# Altium footprint library ICs And Semiconductors SMD.PcbLib: 602 footprints (part 21 of 38)
Each footprint in its own frame and in the unit in brackets; x right, y up, seen from the top. Pads: shape width x height; smd on the part's side, far side on the other; paste and mask are expansions set on the pad; w line width, h text height; cw(c..) or ccw(c..) is an arc to the next point about the centre after c.
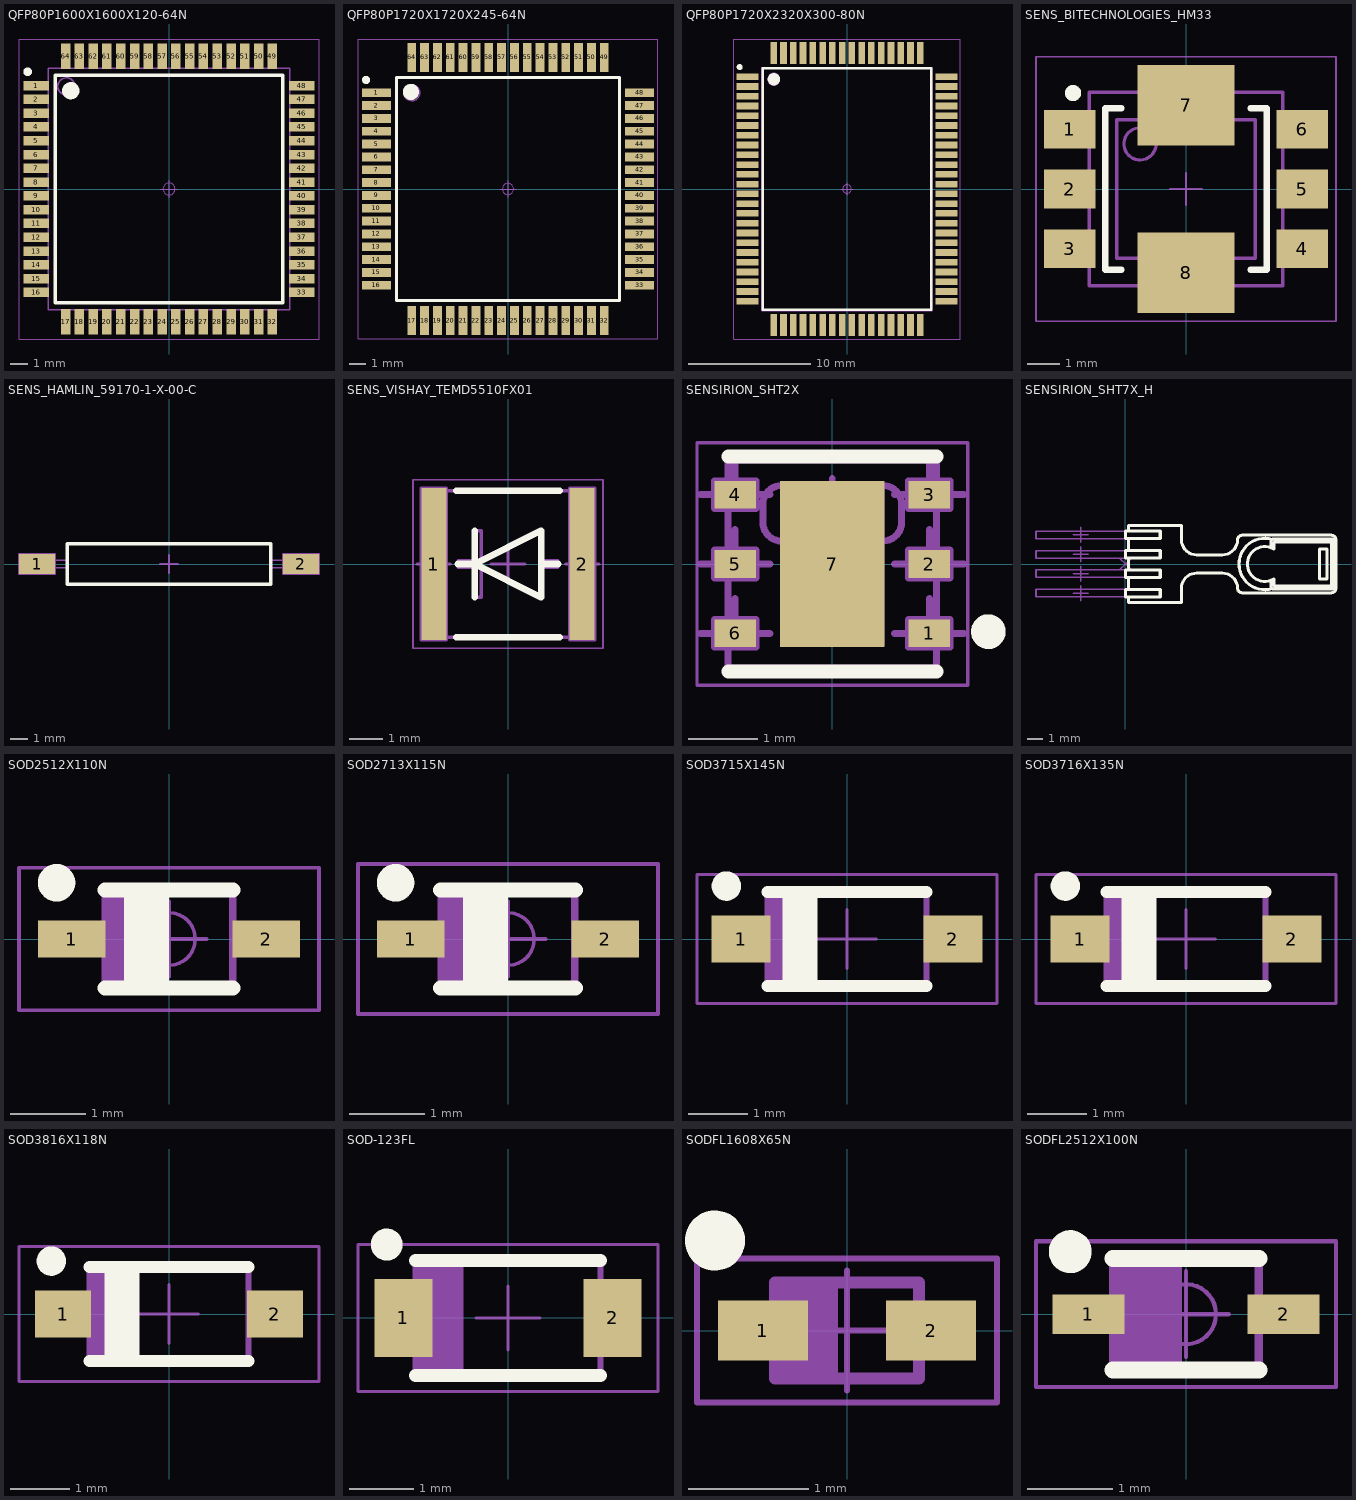
[diagram p20: the footprints below, top view; thin cyan lines are the x and y axes]

## QFP80P1600X1600X120-64N [mm] "QFP, 0.80mm Pitch, Square; 64 Pin, 14.00mm L X 14.00mm W X 1.20mm H Body, IPC Medium Density"
height 1.2
pads (64):
  rect 1.5x0.55 smd: 1(-7.7,6) 2(-7.7,5.2) 3(-7.7,4.4) 4(-7.7,3.6) 5(-7.7,2.8) 6(-7.7,2) 7(-7.7,1.2) 8(-7.7,0.4) 9(-7.7,-0.4) 10(-7.7,-1.2) 11(-7.7,-2) 12(-7.7,-2.8) 13(-7.7,-3.6) 14(-7.7,-4.4) 15(-7.7,-5.2) 16(-7.7,-6) 33(7.7,-6) 34(7.7,-5.2) 35(7.7,-4.4) 36(7.7,-3.6) 37(7.7,-2.8) 38(7.7,-2) 39(7.7,-1.2) 40(7.7,-0.4) 41(7.7,0.4) 42(7.7,1.2) 43(7.7,2) 44(7.7,2.8) 45(7.7,3.6) 46(7.7,4.4) 47(7.7,5.2) 48(7.7,6)
  rect 0.55x1.5 smd: 17(-6,-7.7) 18(-5.2,-7.7) 19(-4.4,-7.7) 20(-3.6,-7.7) 21(-2.8,-7.7) 22(-2,-7.7) 23(-1.2,-7.7) 24(-0.4,-7.7) 25(0.4,-7.7) 26(1.2,-7.7) 27(2,-7.7) 28(2.8,-7.7) 29(3.6,-7.7) 30(4.4,-7.7) 31(5.2,-7.7) 32(6,-7.7) 49(6,7.7) 50(5.2,7.7) 51(4.4,7.7) 52(3.6,7.7) 53(2.8,7.7) 54(2,7.7) 55(1.2,7.7) 56(0.4,7.7) 57(-0.4,7.7) 58(-1.2,7.7) 59(-2,7.7) 60(-2.8,7.7) 61(-3.6,7.7) 62(-4.4,7.7) 63(-5.2,7.7) 64(-6,7.7)
Top Overlay:
  circle w0.25: c-8.2,6.8 r0.125
  circle w0.5: c-5.7,5.7 r0.25
  lines w0.2: -6.6,-6.6 6.6,-6.6 6.6,6.6 -6.6,6.6 -6.6,-6.6
Mechanical 14:
  circle w0.1: c-5.95,5.95 r0.5
  lines w0.1: -7,-7 7,-7 7,7 -7,7 -7,-7
Mechanical 15:
  circle w0.05: c0,0 r0.35
  lines w0.05: -0.5,0 0.5,0 ; 0,-0.5 0,0.5 ; -8.7,-8.7 8.7,-8.7 8.7,8.7 -8.7,8.7 -8.7,-8.7
3D body "QFP80P1600X1600X120-64N.stp": height 1.2, standoff 0, extent -8.016,-8.016 8.016,8.016

## QFP80P1720X1720X245-64N [mm] "QFP, 0.80mm Pitch, Square; 64 pin, 14.00mm L X 14.00mm W X 2.45mm H body, IPC Medium Density"
height 2.45
pads (64):
  rect 1.8x0.55 smd: 1(-8.2,6) 2(-8.2,5.2) 3(-8.2,4.4) 4(-8.2,3.6) 5(-8.2,2.8) 6(-8.2,2) 7(-8.2,1.2) 8(-8.2,0.4) 9(-8.2,-0.4) 10(-8.2,-1.2) 11(-8.2,-2) 12(-8.2,-2.8) 13(-8.2,-3.6) 14(-8.2,-4.4) 15(-8.2,-5.2) 16(-8.2,-6) 33(8.2,-6) 34(8.2,-5.2) 35(8.2,-4.4) 36(8.2,-3.6) 37(8.2,-2.8) 38(8.2,-2) 39(8.2,-1.2) 40(8.2,-0.4) 41(8.2,0.4) 42(8.2,1.2) 43(8.2,2) 44(8.2,2.8) 45(8.2,3.6) 46(8.2,4.4) 47(8.2,5.2) 48(8.2,6)
  rect 0.55x1.8 smd: 17(-6,-8.2) 18(-5.2,-8.2) 19(-4.4,-8.2) 20(-3.6,-8.2) 21(-2.8,-8.2) 22(-2,-8.2) 23(-1.2,-8.2) 24(-0.4,-8.2) 25(0.4,-8.2) 26(1.2,-8.2) 27(2,-8.2) 28(2.8,-8.2) 29(3.6,-8.2) 30(4.4,-8.2) 31(5.2,-8.2) 32(6,-8.2) 49(6,8.2) 50(5.2,8.2) 51(4.4,8.2) 52(3.6,8.2) 53(2.8,8.2) 54(2,8.2) 55(1.2,8.2) 56(0.4,8.2) 57(-0.4,8.2) 58(-1.2,8.2) 59(-2,8.2) 60(-2.8,8.2) 61(-3.6,8.2) 62(-4.4,8.2) 63(-5.2,8.2) 64(-6,8.2)
Top Overlay:
  circle w0.25: c-8.85,6.8 r0.125
  circle w0.5: c-6.05,6.05 r0.25
  lines w0.2: -6.95,-6.95 6.95,-6.95 6.95,6.95 -6.95,6.95 -6.95,-6.95
Mechanical 14:
  circle w0.1: c-6,6 r0.5
  lines w0.1: -7,-7 7,-7 7,7 -7,7 -7,-7
Mechanical 15:
  circle w0.05: c0,0 r0.35
  lines w0.05: -0.5,0 0.5,0 ; 0,-0.5 0,0.5 ; -9.35,-9.35 9.35,-9.35 9.35,9.35 -9.35,9.35 -9.35,-9.35
3D body "QFP80P1720X1720X245-64N.stp": height 2.45, standoff 0, extent -8.749,-8.749 8.749,8.749

## QFP80P1720X2320X300-80N [mm] "QFP, 0.80mm Pitch, Rect.; 80 Pin, 20.00mm L X 14.00mm W X 3.00mm H body, IPC Medium Density"
height 3
pads (80):
  rect 1.8x0.55 smd: 1(-8.15,9.2) 2(-8.15,8.4) 3(-8.15,7.6) 4(-8.15,6.8) 5(-8.15,6) 6(-8.15,5.2) 7(-8.15,4.4) 8(-8.15,3.6) 9(-8.15,2.8) 10(-8.15,2) 11(-8.15,1.2) 12(-8.15,0.4) 13(-8.15,-0.4) 14(-8.15,-1.2) 15(-8.15,-2) 16(-8.15,-2.8) 17(-8.15,-3.6) 18(-8.15,-4.4) 19(-8.15,-5.2) 20(-8.15,-6) 21(-8.15,-6.8) 22(-8.15,-7.6) 23(-8.15,-8.4) 24(-8.15,-9.2) 41(8.15,-9.2) 42(8.15,-8.4) 43(8.15,-7.6) 44(8.15,-6.8) 45(8.15,-6) 46(8.15,-5.2) 47(8.15,-4.4) 48(8.15,-3.6) 49(8.15,-2.8) 50(8.15,-2) 51(8.15,-1.2) 52(8.15,-0.4) 53(8.15,0.4) 54(8.15,1.2) 55(8.15,2) 56(8.15,2.8) 57(8.15,3.6) 58(8.15,4.4) 59(8.15,5.2) 60(8.15,6) 61(8.15,6.8) 62(8.15,7.6) 63(8.15,8.4) 64(8.15,9.2)
  rect 0.55x1.8 smd: 25(-6,-11.15) 26(-5.2,-11.15) 27(-4.4,-11.15) 28(-3.6,-11.15) 29(-2.8,-11.15) 30(-2,-11.15) 31(-1.2,-11.15) 32(-0.4,-11.15) 33(0.4,-11.15) 34(1.2,-11.15) 35(2,-11.15) 36(2.8,-11.15) 37(3.6,-11.15) 38(4.4,-11.15) 39(5.2,-11.15) 40(6,-11.15) 65(6,11.15) 66(5.2,11.15) 67(4.4,11.15) 68(3.6,11.15) 69(2.8,11.15) 70(2,11.15) 71(1.2,11.15) 72(0.4,11.15) 73(-0.4,11.15) 74(-1.2,11.15) 75(-2,11.15) 76(-2.8,11.15) 77(-3.6,11.15) 78(-4.4,11.15) 79(-5.2,11.15) 80(-6,11.15)
Top Overlay:
  circle w0.25: c-8.8,10 r0.125
  circle w0.5: c-6,9 r0.25
  lines w0.2: -6.9,-9.9 -6.9,9.9 6.9,9.9 6.9,-9.9 -6.9,-9.9
Mechanical 14:
  circle w0.1: c-6,9 r0.5
  lines w0.1: -7,-10 -7,10 7,10 7,-10 -7,-10
Mechanical 15:
  circle w0.05: c0,0 r0.35
  lines w0.05: -0.5,0 0.5,0 ; 0,-0.5 0,0.5 ; -9.3,-12.3 -9.3,12.3 9.3,12.3 9.3,-12.3 -9.3,-12.3
3D body "QFP80P1720X2320X300-80N.stp": height 3, standoff 0, extent -8.617,-11.617 8.618,11.618

## SENS_BITECHNOLOGIES_HM33 [mm] "BITECHNOLOGIES HM33 Serie, Current Sense SMD Transformers, 8-Leads, Pitch 1.85mm"
height 5.33
pads (8):
  rect 1.6x1.2 smd: 1(-3.6,1.85) 2(-3.6,0) 3(-3.6,-1.85) 4(3.6,-1.85) 5(3.6,0) 6(3.6,1.85)
  rect 3x2.5 smd: 7(0,2.6) 8(0,-2.6)
Top Overlay:
  circle w0.25: c-3.5,2.975 r0.125
  lines w0.2: -2,-2.5 -2.5,-2.5 -2.5,2.5 -2,2.5 ; 2,-2.5 2.5,-2.5 2.5,2.5 2,2.5
Mechanical 14:
  circle w0.1: c-1.425,1.4 r0.5
  lines w0.1: -3,-3 3,-3 3,3 -3,3 -3,-3 ; -2.15,-2.15 -2.15,2.15 2.15,2.15 2.15,-2.15 -2.15,-2.15
Mechanical 15:
  lines w0.05: -0.5,0 0.5,0 ; 0,-0.5 0,0.5 ; -4.65,-4.1 -4.65,4.1 4.65,4.1 4.65,-4.1 -4.65,-4.1
3D body: height 2.6, standoff 0, extent -2.999,-2.999 2.999,2.999
3D body: height 5.33, standoff 0, extent -2.149,-2.149 2.149,2.149

## SENS_HAMLIN_59170-1-X-00-C [mm] "SMD Proximity Sensor, HAMLIN 59170 Serie"
height 2.41
pads (2):
  rect 2.03x1.14 smd: 1(-7.425,0) 2(7.425,0)
Top Overlay:
  lines w0.2: -5.715,-1.145 5.715,-1.145 5.715,1.145 -5.715,1.145 -5.715,-1.145
Mechanical 8:
  lines w0.1: -7.925,0 -7.425,0 ; -7.425,-0.5 -7.425,0 ; -7.425,0.5 -7.425,0 ; -6.925,0 -7.425,0 ; -0.5,0 0,0 ; 0,-0.5 0,0 ; 0,0.5 0,0 ; 0.5,0 0,0 ; 6.925,0 7.425,0 ; 7.425,-0.5 7.425,0 ; 7.425,0.5 7.425,0 ; 7.925,0 7.425,0 ; -8.44,-0.57 -8.44,0.57 -6.41,0.57 -6.41,-0.57 -8.44,-0.57 ; 6.41,-0.57 6.41,0.57 8.44,0.57 8.44,-0.57 6.41,-0.57
Mechanical 14:
  lines w0.1: -5.715,-0.215 -8.125,-0.215 -8.125,0.215 -5.715,0.215 ; 5.715,-0.215 8.125,-0.215 8.125,0.215 5.715,0.215 ; -5.715,-1.145 5.715,-1.145 5.715,1.145 -5.715,1.145 -5.715,-1.145
3D body "SENS_HAMLIN_59170-1-X-00-C.stp": height 2.29, standoff 0, extent -8.125,-1.145 8.125,1.145

## SENS_VISHAY_TEMD5510FX01 [mm] "SMD Ambient Light Sensor L 5mm x W 4.24 x H 1.12"
height 1.12
pads (2):
  rect 0.75x4.55 smd: 1(-2.225,0) 2(2.225,0)
Top Overlay:
  lines w0.2: -1.55,-2.195 1.55,-2.195 ; -1.55,2.195 1.55,2.195 ; -1.5,0 -1,0 ; -1,-1 -1,1 ; 1,0 1.5,0 ; -1,0 1,-1 1,1 -1,0
Mechanical 8:
  lines w0.1: -2.725,0 -2.225,0 ; -2.225,-0.5 -2.225,0 ; -2.225,0.5 -2.225,0 ; -1.725,0 -2.225,0 ; -0.5,0 0,0 ; 0,-0.5 0,0 ; 0,0.5 0,0 ; 0.5,0 0,0 ; 1.725,0 2.225,0 ; 2.225,-0.5 2.225,0 ; 2.225,0.5 2.225,0 ; 2.725,0 2.225,0 ; -2.6,-2.275 -2.6,2.275 -1.85,2.275 -1.85,-2.275 -2.6,-2.275 ; 1.85,-2.275 1.85,2.275 2.6,2.275 2.6,-2.275 1.85,-2.275
Mechanical 14:
  lines w0.1: -2.275,-2.195 -2.275,2.195 ; 2.275,-2.195 2.275,2.195 ; -2.575,-2.195 2.575,-2.195 2.575,2.195 -2.575,2.195 -2.575,-2.195 ; -1.5,-0.1 -1,-0.1 -1,-1 -0.8,-1 -0.8,-0.1 1,-1 1,-0.1 1.5,-0.1 1.5,0.1 1,0.1 1,1 -0.8,0.1 -0.8,1 -1,1 -1,0.1 -1.5,0.1 -1.5,-0.1
Mechanical 15:
  lines w0.05: -2.85,-2.525 -2.85,2.525 2.85,2.525 2.85,-2.525 -2.85,-2.525
3D body "SENS_VISHAY_TEMD5510FX01.stp": height 1.12, standoff 0, extent -2.575,-2.195 2.575,2.195

## SENSIRION_SHT2X [mm] "SON, 1.00mm, Pitch; 6 Pin, 3.00mm W X 3.00mm L X 1.20mm H body (W/Thermal Tab 1.40 X 2.3mm), SEMIRION DFN"
height 1.2
pads (7):
  rect 0.6x0.4 smd: 1(1.4,-1) 2(1.4,0) 3(1.4,1) 4(-1.4,1) 5(-1.4,0) 6(-1.4,-1)
  rect 1.5x2.4 smd: 7(0,0)
Top Overlay:
  circle w0.25: c2.25,-0.975 r0.125
  lines w0.2: -1.5,-1.55 1.5,-1.55 ; -1.5,1.55 1.5,1.55
Mechanical 8:
  lines w0.1: -1.9,-1 -1.4,-1 ; -1.9,0 -1.4,0 ; -1.9,1 -1.4,1 ; -1.4,-0.5 -1.4,-1 ; -1.4,0.5 -1.4,0 ; -1.4,1.5 -1.4,1 ; -0.9,-1 -1.4,-1 ; -0.9,0 -1.4,0 ; -0.9,1 -1.4,1 ; -0.5,0.731 0,0.731 ; -0.354,-0.354 0,0 ; -0.354,0.354 0,0 ; 0,0.231 0,0.731 ; 0,1.231 0,0.731 ; 0.354,-0.354 0,0 ; 0.354,0.354 0,0 ; 0.5,0.731 0,0.731 ; 0.9,-1 1.4,-1 ; 0.9,0 1.4,0 ; 0.9,1 1.4,1 ; 1.4,-0.5 1.4,-1 ; 1.4,0.5 1.4,0 ; 1.4,1.5 1.4,1 ; 1.9,-1 1.4,-1 ; 1.9,0 1.4,0 ; 1.9,1 1.4,1 ; -1.7,-1.2 -1.7,-0.8 -1.1,-0.8 -1.1,-1.2 -1.7,-1.2 ; -1.7,-0.2 -1.7,0.2 -1.1,0.2 -1.1,-0.2 -1.7,-0.2 ; -1.7,0.8 -1.7,1.2 -1.1,1.2 -1.1,0.8 -1.7,0.8 ; -0.7,-1.15 0.7,-1.15 0.7,1.15 -0.7,1.15 -0.7,-1.15 ; 1.1,-1.2 1.1,-0.8 1.7,-0.8 1.7,-1.2 1.1,-1.2 ; 1.1,-0.2 1.1,0.2 1.7,0.2 1.7,-0.2 1.1,-0.2 ; 1.1,0.8 1.1,1.2 1.7,1.2 1.7,0.8 1.1,0.8
Mechanical 14:
  lines w0.1: 0.7,0.647 0.7,0.754 ; -1.5,-1.5 1.5,-1.5 1.5,1.5 -1.5,1.5 -1.5,-1.5 ; -1,0.601 ccw(c-0.73,0.601) -0.73,0.331 0.73,0.331 ccw(c0.73,0.601) 1,0.601 1,0.861 ccw(c0.73,0.861) 0.73,1.131 -0.73,1.131 ccw(c-0.73,0.861) -1,0.861 -1,0.601 ; -0.7,0.671 ccw(c-0.61,0.671) -0.61,0.581 0.61,0.581 ccw(c0.61,0.671) 0.7,0.671 0.7,0.791 ccw(c0.61,0.791) 0.61,0.881 -0.61,0.881 ccw(c-0.61,0.791) -0.7,0.791 -0.7,0.671
Mechanical 15:
  lines w0.05: -1.95,-1.75 -1.95,1.75 1.95,1.75 1.95,-1.75 -1.95,-1.75
3D body "SENSIRION_SHT2X.stp": height 1.05, standoff 0, extent -1.5,-1.5 1.5,1.5

## SENSIRION_SHT7X_H [mm] "Pitch; 1.27, 3.7mm W X 13.5mm L X 3.1mm H body SENSIRION SHT7x Serie"
height 3.1
Top Overlay:
  lines w0.2: 0.221,-1.67 0,-1.67 0,-2.17 0.2,-2.17 ; 0.221,-0.39 0,-0.39 0,-0.89 0.2,-0.89 ; 0.221,1.67 0,1.67 0,2.17 0.2,2.17 ; 9.6,-1.078 9.6,-1.45 ccw(c9.8,-1.45) 9.8,-1.65 13.6,-1.65 ccw(c13.6,-1.45) 13.8,-1.45 13.8,1.45 ccw(c13.6,1.45) 13.6,1.65 9.8,1.65 ccw(c9.8,1.45) 9.6,1.45 9.6,1.078 ; 9.702,-1.624 cw(c9.2,0) 9.702,1.624 ; 0.2,-2.17 2.3,-2.17 2.3,-1.67 0.2,-1.67 0.2,-0.89 ; 0.2,-2.17 0.2,-2.54 3.7,-2.54 3.7,-1.6 cw(c4.7,-1.6) 4.7,-0.6 6.4,-0.6 cw(c6.4,-1.6) 7.4,-1.6 ccw(c7.7,-1.6) 7.7,-1.9 13.6,-1.9 ccw(c13.6,-1.6) 13.9,-1.6 13.9,1.6 ccw(c13.6,1.6) 13.6,1.9 7.7,1.9 ccw(c7.7,1.6) 7.4,1.6 cw(c6.4,1.6) 6.4,0.6 4.7,0.6 cw(c4.7,1.6) 3.7,1.6 3.7,2.54 0.2,2.54 0.2,2.17 ; 0.2,-0.89 2.3,-0.89 2.3,-0.39 0.2,-0.39 0.2,0.39 ; 0.2,0.39 2.3,0.39 2.3,0.89 0.2,0.89 ; 0.2,0.39 0,0.39 0,0.89 0.2,0.89 ; 0.2,0.89 0.2,1.67 2.299,1.67 2.3,2.17 0.2,2.17 ; 9.8,-1.45 13.6,-1.45 13.6,1.45 9.8,1.45 9.8,0.981 ccw(c9.2,0) 9.8,-0.981 9.8,-1.45 ; 12.8,-1 13.3,-1 13.3,1 12.8,1 12.8,-1
Mechanical 8:
  lines w0.1: -3.45,-1.92 -2.95,-1.92 ; -3.45,-0.64 -2.95,-0.64 ; -3.45,0.64 -2.95,0.64 ; -3.45,1.92 -2.95,1.92 ; -2.95,-2.42 -2.95,-1.92 ; -2.95,-1.42 -2.95,-1.92 ; -2.95,-1.14 -2.95,-0.64 ; -2.95,-0.14 -2.95,-0.64 ; -2.95,0.14 -2.95,0.64 ; -2.95,1.14 -2.95,0.64 ; -2.95,1.42 -2.95,1.92 ; -2.95,2.42 -2.95,1.92 ; -2.45,-1.92 -2.95,-1.92 ; -2.45,-0.64 -2.95,-0.64 ; -2.45,0.64 -2.95,0.64 ; -2.45,1.92 -2.95,1.92 ; -0.354,-0.354 0,0 ; -0.354,0.354 0,0 ; 0,-1.67 -5.9,-1.67 -5.9,-2.17 0.003,-2.17 0.003,-1.67 ; 0.354,-0.354 0,0 ; 0.354,0.354 0,0 ; -5.9,-0.89 0.015,-0.89 0.015,-0.39 -5.9,-0.39 -5.9,-0.89 ; -5.9,0.39 0,0.39 0,0.89 -5.9,0.89 -5.9,0.39 ; -5.9,1.67 -5.9,2.17 0,2.17 0,1.67 -5.9,1.67
Mechanical 14:
  lines w0.1: 0,-0.89 0,-0.39 ; 0.2,-2.17 0.2,-2.54 3.7,-2.54 3.7,-1.6 cw(c4.7,-1.6) 4.7,-0.6 6.4,-0.6 cw(c6.4,-1.6) 7.4,-1.6 ccw(c7.7,-1.6) 7.7,-1.9 13.6,-1.9 ccw(c13.6,-1.6) 13.9,-1.6 13.9,1.6 ccw(c13.6,1.6) 13.6,1.9 7.7,1.9 ccw(c7.7,1.6) 7.4,1.6 cw(c6.4,1.6) 6.4,0.6 4.7,0.6 cw(c4.7,1.6) 3.7,1.6 3.7,2.54 0.2,2.54 0.2,2.17 ; 0.2,-1.67 0.2,-0.89 ; 0.2,-0.39 0.2,0.39 ; 0.2,0.89 0.2,1.67 ; 9.6,-1.078 9.6,-1.45 ccw(c9.8,-1.45) 9.8,-1.65 13.6,-1.65 ccw(c13.6,-1.45) 13.8,-1.45 13.8,1.45 ccw(c13.6,1.45) 13.6,1.65 9.8,1.65 ccw(c9.8,1.45) 9.6,1.45 9.6,1.078 ; 9.702,-1.624 cw(c9.2,0) 9.702,1.624 ; 0,0.39 2.3,0.39 2.3,0.89 0,0.89 ; 0,0.39 0,0.89 ; 0,0.39 0,0.89 ; 0,1.67 0,2.17 ; 0,1.67 2.299,1.67 2.3,2.17 0,2.17 ; 0,1.67 0,2.17 ; 0.003,-2.17 2.3,-2.17 2.3,-1.67 0.003,-1.67 0.003,-2.17 ; 0.015,-0.89 2.3,-0.89 2.3,-0.39 0.015,-0.39 0.015,-0.89 ; 9.8,-1.45 13.6,-1.45 13.6,1.45 9.8,1.45 9.8,0.981 ccw(c9.2,0) 9.8,-0.981 9.8,-1.45 ; 12.8,-1 13.3,-1 13.3,1 12.8,1 12.8,-1
3D body "SENSIRION_SHT7X_H.stp": height 3.4, standoff 0, extent -2.8,-2.54 13.9,2.54

## SOD2512X110N [mm] "Small Outline Diode Flat Lead (SOD-323), 1.70mm W X 1.25mm L X 1.10mm H body,  IPC Medium Density"
height 1.1
pads (2):
  rect 0.9x0.5 smd: 1(-1.3,0) 2(1.3,0)
Top Overlay:
  circle w0.25: c-1.5,0.75 r0.125
  lines w0.2: -0.85,-0.65 0.85,-0.65 ; -0.85,0.65 0.85,0.65 ; -0.5,-0.65 -0.5,0.65 ; -0.3,-0.65 -0.3,0.65 ; -0.1,-0.65 -0.1,0.65
Mechanical 14:
  lines w0.1: -0.75,-0.625 -0.75,0.625 ; -0.65,-0.625 -0.65,0.625 ; -0.55,-0.625 -0.55,0.625 ; -0.45,-0.625 -0.45,0.625 ; -0.35,-0.625 -0.35,0.625 ; -0.25,-0.625 -0.25,0.625 ; -0.15,-0.625 -0.15,0.625 ; -0.85,-0.625 -0.85,0.625 ; -0.85,-0.625 -0.85,0.625 ; -0.85,-0.625 0.85,-0.625 0.85,0.625 -0.85,0.625
Mechanical 15:
  circle w0.05: c0,0 r0.35
  lines w0.05: -0.5,0 0.5,0 ; 0,-0.5 0,0.5 ; -2,-0.95 -2,0.95 2,0.95 2,-0.95 -2,-0.95
3D body "SOD2512X110N(SOD-323).stp": height 1.1, standoff 0, extent -1.35,-0.675 1.35,0.675

## SOD2713X115N [mm] "SOD-323 Diode; 1.775mm W X 1.30mm L X 1.15mm H Body, IPC Medium Density"
height 1.18
pads (2):
  rect 0.9x0.5 smd: 1(-1.3,0) 2(1.3,0)
Top Overlay:
  circle w0.25: c-1.5,0.75 r0.125
  lines w0.2: -0.9,-0.65 0.9,-0.65 ; -0.9,0.65 0.9,0.65 ; -0.5,-0.65 -0.5,0.65 ; -0.3,-0.65 -0.3,0.65 ; -0.1,-0.65 -0.1,0.65
Mechanical 14:
  lines w0.1: -0.788,-0.65 -0.788,0.65 ; -0.688,-0.65 -0.688,0.65 ; -0.588,-0.65 -0.588,0.65 ; -0.488,-0.65 -0.488,0.65 ; -0.388,-0.65 -0.388,0.65 ; -0.288,-0.65 -0.288,0.65 ; -0.188,-0.65 -0.188,0.65 ; -0.088,-0.65 -0.088,0.65 ; -0.888,-0.65 -0.888,0.65 ; -0.888,-0.65 -0.888,0.65 ; -0.888,-0.65 0.888,-0.65 0.888,0.65 -0.888,0.65
  text "1" at 0.45,-0.164 h0.75
Mechanical 15:
  circle w0.05: c0,0 r0.35
  lines w0.05: -0.5,0 0.5,0 ; 0,-0.5 0,0.5 ; -2,-1 -2,1 2,1 2,-1 -2,-1
3D body "SOD2713X115N.stp": height 1.15, standoff 0, extent -1.425,-0.75 1.425,0.75

## SOD3715X145N [mm] "SOD Diode (SOD-123); 2.70mm W X 1.55mm L X 1.45mm H body, IPC Medium Density"
height 1.45
pads (2):
  rect 1x0.8 smd: 1(-1.8,0) 2(1.8,0)
Top Overlay:
  circle w0.25: c-2.05,0.9 r0.125
  lines w0.2: -1.35,-0.8 1.35,-0.8 ; -1.35,0.8 1.35,0.8 ; -1,-0.8 -1,0.8 ; -0.8,-0.8 -0.8,0.8 ; -0.6,-0.8 -0.6,0.8
Mechanical 14:
  lines w0.1: -1.25,-0.775 -1.25,0.775 ; -1.15,-0.775 -1.15,0.775 ; -1.05,-0.775 -1.05,0.775 ; -0.95,-0.775 -0.95,0.775 ; -0.85,-0.775 -0.85,0.775 ; -0.75,-0.775 -0.75,0.775 ; -0.65,-0.775 -0.65,0.775 ; -1.35,-0.775 -1.35,0.775 1.35,0.775 1.35,-0.775 -1.35,-0.775
Mechanical 15:
  lines w0.05: -0.5,0 0.5,0 ; 0,-0.5 0,0.5 ; -2.55,-1.1 -2.55,1.1 2.55,1.1 2.55,-1.1 -2.55,-1.1
3D body "SOD3715X145N(SOD123).stp": height 1.45, standoff 0, extent -1.95,-0.85 1.95,0.85

## SOD3716X135N [mm] "SOD Diode (SOD-123), 2.70mm W X 1.60mm L X 1.35mm H body, IPC Medium Density"
height 1.35
pads (2):
  rect 1x0.8 smd: 1(-1.8,0) 2(1.8,0)
Top Overlay:
  circle w0.25: c-2.05,0.9 r0.125
  lines w0.2: -1.35,-0.8 1.35,-0.8 ; -1.35,0.8 1.35,0.8 ; -1,-0.8 -1,0.8 ; -0.8,-0.8 -0.8,0.8 ; -0.6,-0.8 -0.6,0.8
Mechanical 14:
  lines w0.1: -1.25,-0.775 -1.25,0.775 ; -1.15,-0.775 -1.15,0.775 ; -1.05,-0.775 -1.05,0.775 ; -0.95,-0.775 -0.95,0.775 ; -0.85,-0.775 -0.85,0.775 ; -0.75,-0.775 -0.75,0.775 ; -0.65,-0.775 -0.65,0.775 ; -1.35,-0.775 1.35,-0.775 1.35,0.775 -1.35,0.775 -1.35,-0.775
Mechanical 15:
  lines w0.05: -0.5,0 0.5,0 ; 0,-0.5 0,0.5 ; -2.55,-1.1 2.55,-1.1 2.55,1.1 -2.55,1.1 -2.55,-1.1
3D body "SOD3716X135N.stp": height 1.35, standoff 0, extent -1.95,-0.85 1.95,0.85

## SOD3816X118N [mm] "SOD Diode (SOD-123); 2.70mm W X 1.60mm L X 1.18mm H body, IPC Medium Density"
height 1.18
pads (2):
  rect 0.95x0.8 smd: 1(-1.8,0) 2(1.8,0)
Top Overlay:
  circle w0.25: c-2,0.9 r0.125
  lines w0.2: -1.35,-0.8 1.35,-0.8 ; -1.35,0.8 1.35,0.8 ; -1,-0.8 -1,0.8 ; -0.8,-0.8 -0.8,0.8 ; -0.6,-0.8 -0.6,0.8
Mechanical 14:
  lines w0.1: -1.25,-0.8 -1.25,0.8 ; -1.15,-0.8 -1.15,0.8 ; -1.05,-0.8 -1.05,0.8 ; -0.95,-0.8 -0.95,0.8 ; -0.85,-0.8 -0.85,0.8 ; -0.75,-0.8 -0.75,0.8 ; -0.65,-0.8 -0.65,0.8 ; -1.35,-0.8 1.35,-0.8 1.35,0.8 -1.35,0.8 -1.35,-0.8
Mechanical 15:
  lines w0.05: -0.5,0 0.5,0 ; 0,-0.5 0,0.5 ; -2.55,-1.15 2.55,-1.15 2.55,1.15 -2.55,1.15 -2.55,-1.15
3D body "SOD3816X118N.stp": height 1.18, standoff 0, extent -1.95,-0.901 1.95,0.899

## SOD-123FL [mm] "Small Outline Diode Flat Lead (SOD-123FL), Body; 2.70mm L X 1.65mm W X 1.0mm H"
height 1
pads (2):
  rect 0.91x1.22 smd: 1(-1.64,0) 2(1.64,0)
Top Overlay:
  circle w0.25: c-1.9,1.15 r0.125
  lines w0.2: -1.45,-0.9 1.45,-0.9 ; -1.45,0.9 1.45,0.9
Mechanical 14:
  lines w0.1: -1.45,-0.55 -1.75,-0.55 -1.75,0.55 -1.45,0.55 ; -1.35,-0.9 -1.35,0.9 ; -1.25,-0.9 -1.25,0.9 ; -1.15,-0.9 -1.15,0.9 ; -1.05,-0.9 -1.05,0.9 ; -0.95,-0.9 -0.95,0.9 ; -0.85,-0.9 -0.85,0.9 ; -0.75,-0.9 -0.75,0.9 ; 1.45,-0.55 1.75,-0.55 1.75,0.55 1.45,0.55 ; -1.45,-0.9 -1.45,0.9 1.45,0.9 1.45,-0.9 -1.45,-0.9
Mechanical 15:
  lines w0.05: -0.5,0 0.5,0 ; 0,-0.5 0,0.5 ; -2.35,-1.15 -2.35,1.15 2.35,1.15 2.35,-1.15 -2.35,-1.15
3D body "SOD-123LF.stp": height 1, standoff 0, extent -1.75,-0.9 1.75,0.9

## SODFL1608X65N [mm] "Ultra Small Outline Diode Flat Lead (SOD-523), Body; 1.2mm L X 0.8mm W X 0.65mm H, IPC Medium Density"
height 0.65
pads (2):
  rect 0.75x0.5 smd: 1(-0.7,0) 2(0.7,0)
Top Overlay:
  circle w0.25: c-1.1,0.75 r0.125
Mechanical 14:
  lines w0.1: -0.5,-0.4 -0.5,0.4 ; -0.425,-0.4 -0.425,0.4 ; -0.35,-0.4 -0.35,0.4 ; -0.275,-0.4 -0.275,0.4 ; -0.2,0.4 -0.2,-0.4 -0.175,-0.4 ; -0.125,-0.4 -0.125,0.4 ; -0.6,-0.4 -0.6,0.4 0.6,0.4 0.6,-0.4 -0.6,-0.4
Mechanical 15:
  lines w0.05: -0.5,0 0.5,0 ; 0,-0.5 0,0.5 ; -1.25,-0.6 -1.25,0.6 1.25,0.6 1.25,-0.6 -1.25,-0.6
3D body "SODFL1608X65N.stp": height 0.65, standoff 0, extent -0.825,-0.425 0.825,0.425

## SODFL2512X100N [mm] "SODFL Diode; 1.70mm W X 1.25mm L X 1.00mm H body, IPC Medium Density"
height 1
pads (2):
  rect 0.84x0.46 smd: 1(-1.14,0) 2(1.14,0)
Top Overlay:
  circle w0.25: c-1.35,0.73 r0.125
  lines w0.2: -0.85,-0.65 0.85,-0.65 ; -0.85,0.65 0.85,0.65
Mechanical 14:
  region: -0.85,-0.625 -0.05,-0.625 -0.05,0.625 -0.85,0.625
  lines w0.1: -0.85,-0.625 0.85,-0.625 0.85,0.625 -0.85,0.625 -0.85,-0.625
Mechanical 15:
  circle w0.05: c0,0 r0.35
  lines w0.05: -0.5,0 0.5,0 ; 0,-0.5 0,0.5 ; -1.75,-0.85 1.75,-0.85 1.75,0.85 -1.75,0.85 -1.75,-0.85
3D body "SODFL2512X100N.stp": height 1, standoff 0, extent -1.35,-0.65 1.35,0.65